# Altium footprint library KHOEMACH_PCBLIB.PcbLib: 28 footprints (part 2 of 2)
Each footprint in its own frame and in the unit in brackets; x right, y up, seen from the top. Pads: shape width x height; smd on the part's side, far side on the other; paste and mask are expansions set on the pad; w line width, h text height; cw(c..) or ccw(c..) is an arc to the next point about the centre after c.
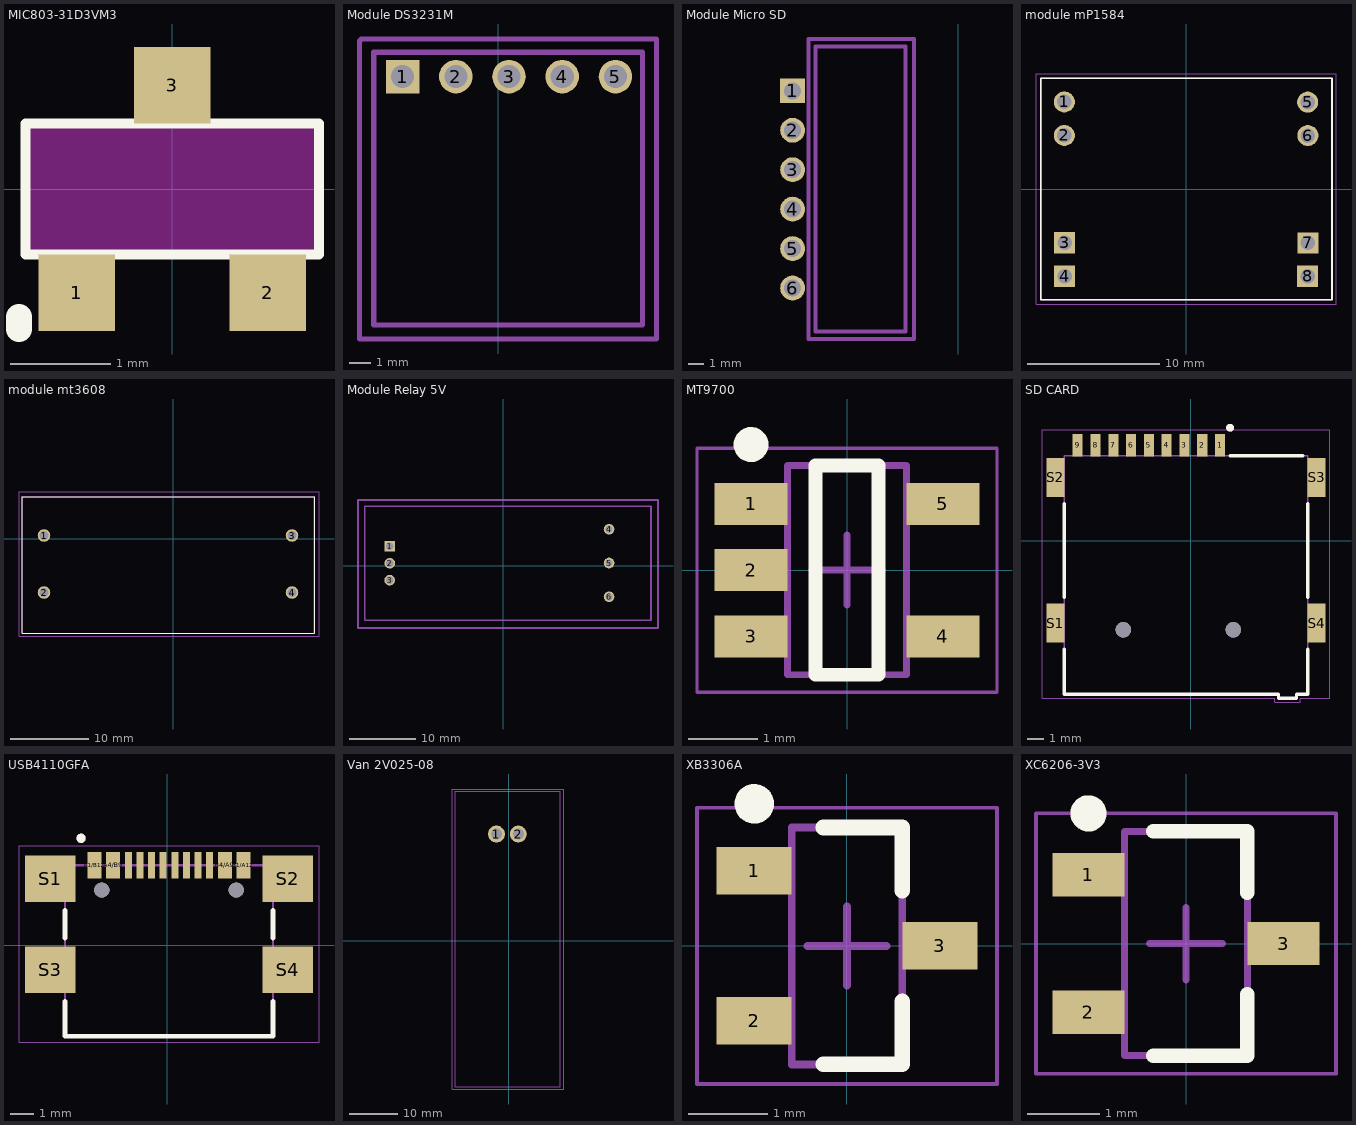
[diagram p1: the footprints below, top view; thin cyan lines are the x and y axes]

## MIC803-31D3VM3 [mm]
pads (3):
  rect 0.76x0.76 smd paste+0 mask+0.05: 1(-0.95,-1.03) 2(0.95,-1.03) 3(0,1.03)
Top Layer keep-out:
  rectangle: -1.46,-0.65 1.46,0.65
Top Overlay:
  lines w0.1: -1.46,-0.65 1.46,-0.65 1.46,0.65 -1.46,0.65 -1.46,-0.65
  lines w0.254: -1.524,-1.397 -1.524,-1.27
3D body "SOT-23_M3_MCH.step": height 1.12, standoff 0, extent -1.524,-1.321 1.524,1.321

## Module DS3231M [mm]
pads (5):
  rect 1.6x1.6 hole 1.1: 1(-4.572,25.4)
  round 1.6 hole 1.1: 2(-2.032,25.4) 3(0.508,25.4) 4(3.048,25.4) 5(5.588,25.4)
Mechanical 13:
  lines w0.254: -5.95,13.55 -5.95,26.57 6.88,26.57 6.88,13.55 -5.95,13.55
Mechanical 15:
  lines w0.254: -6.63,12.88 7.55,12.88 7.55,27.197 -6.537,27.197 -6.63,27.104 -6.63,12.88
3D body "DS3231 Module With Header.step": height 16.35, standoff -1.74, extent -5.87,13.61 6.83,26.61

## Module Micro SD [mm]
pads (6):
  rect 1.6x1.6 hole 1.1: 1(-10.671,34.07)
  round 1.6 hole 1.1: 2(-10.671,31.53) 3(-10.671,28.99) 4(-10.671,26.45) 5(-10.671,23.91) 6(-10.671,21.37)
Mechanical 13:
  lines w0.254: -9.188,18.581 -3.405,18.581 -3.405,36.915 -9.188,36.915 -9.188,18.581
Mechanical 15:
  lines w0.254: -9.657,18.09 -2.869,18.09 -2.869,37.406 -9.657,37.406 -9.657,18.09
3D body "MicroSD Card Module - 1.stp": height 23.36, standoff 2.73, extent -8.262,18.682 -4.861,36.792
3D body "4Pin.stp": height 5.27, standoff -3.18, extent -11.002,25.188 -3.702,35.348
3D body "2Pin.stp": height 5.27, standoff -3.18, extent -11.002,20.108 -3.702,25.188

## module mP1584 [mm]
height 6.6
pads (8):
  round 1.6 hole 1.1: 1(-9.271,6.604) 2(-9.271,4.064) 5(9.2,6.59) 6(9.21,4.06)
  rect 1.6x1.6 hole 1.1: 3(-9.25,-4.08) 4(-9.25,-6.62) 7(9.21,-4.09) 8(9.19,-6.62)
Top Overlay:
  lines w0.127: -11.06,-8.4 -11.06,8.4 11.04,8.4 11.04,-8.4 -11.06,-8.4
Mechanical 13:
  lines w0.127: -11.04,-8.4 -11.04,8.4 11.06,8.4 11.06,-8.4 -11.04,-8.4
Mechanical 15:
  lines w0.05: -11.42,-8.76 11.35,-8.76 11.35,8.76 -11.42,8.76 -11.42,-8.76
3D body "D-SUN dc-dc step down converter.step": height 6.19, standoff 2, extent -11.05,-8.4 11.05,8.4
3D body "Header, Male, 2.54mm, 1x2.STEP": height 5.54, standoff -6, extent 7.935,-7.929 10.475,-2.849
3D body "Header, Male, 2.54mm, 1x2.STEP": height 5.54, standoff -6, extent -10.52,-7.89 -7.98,-2.81
3D body "Header, Male, 2.54mm, 1x2.STEP": height 5.54, standoff -6, extent -10.536,2.766 -7.996,7.846
3D body "Header, Male, 2.54mm, 1x2.STEP": height 5.54, standoff -6, extent 7.949,2.778 10.489,7.858

## module mt3608 [mm]
height 6.6
pads (4):
  round 1.6 hole 1.1: 1(-16.383,0.381) 2(-16.383,-6.858) 3(15.113,0.381) 4(15.113,-6.858)
Top Overlay:
  lines w0.127: -19.177,-12.065 17.907,-12.065 17.907,5.334 -19.177,5.334 -19.177,-12.065
Mechanical 13:
  lines w0.127: -19.177,-12.065 17.907,-12.065 17.907,5.334 -19.177,5.334 -19.177,-12.065
Mechanical 15:
  lines w0.05: -19.558,-12.446 -19.558,5.969 18.542,5.969 18.542,-12.446 -19.558,-12.446
3D body "MT3608 Converter.STEP": height 9.15, standoff 1.85, extent -19.21,-12.091 17.94,5.334
3D body "1x1 Male Pin Header.stp": height 7.54, standoff -6, extent -17.648,-8.103 -15.103,-5.603
3D body "1x1 Male Pin Header.stp": height 7.54, standoff -6, extent -17.676,-0.846 -15.131,1.654
3D body "1x1 Male Pin Header.stp": height 7.54, standoff -6, extent 13.843,-8.125 16.388,-5.625
3D body "1x1 Male Pin Header.stp": height 7.54, standoff -6, extent 13.838,-0.869 16.383,1.631

## Module Relay 5V [mm]
pads (6):
  rect 1.6x1.6 hole 1.1: 1(-17.121,2.93)
  round 1.6 hole 1.1: 2(-17.091,0.39) 3(-17.121,-2.15) 4(15.884,5.506) 5(15.884,0.426) 6(15.884,-4.654)
Mechanical 13:
  lines w0.254: -20.852,-8.162 22.199,-8.162 22.199,8.954 -20.852,8.954 -20.852,-8.162
Mechanical 15:
  lines w0.254: -21.882,-9.359 -21.882,9.918 23.25,9.918 23.25,-9.359 -21.882,-9.359
3D body "Header, Male, 2.54mm, 1x3.STEP": height 6, standoff -5.54, extent -18.389,-3.435 -15.849,4.185
3D body "Relay Module 5V.SLDPRT": height 21.7, standoff 1, extent -20.801,-8.116 22.199,8.984
3D body "Header, Male, 2.54mm, 1x5.STEP": height 5.54, standoff -6, extent 14.614,-5.924 17.154,6.776

## MT9700 [mm]
height 1.15
pads (5):
  rect 1.05x0.6 smd: 1(-1.375,0.95) 2(-1.375,0) 3(-1.375,-0.95) 4(1.375,-0.95) 5(1.375,0.95)
Top Overlay:
  circle w0.25: c-1.375,1.8 r0.125
  lines w0.2: -0.45,-1.5 0.45,-1.5 0.45,1.5 -0.45,1.5 -0.45,-1.5
Mechanical 13:
  lines w0.1: -0.85,-1.5 -0.85,1.5 0.85,1.5 0.85,-1.5 -0.85,-1.5
Mechanical 15:
  lines w0.05: -2.15,-1.75 -2.15,1.75 2.15,1.75 2.15,-1.75 -2.15,-1.75
  lines w0.1: -0.5,0 0.5,0 ; 0,-0.5 0,0.5
3D body: height 1.15, standoff 0.1, extent -0.85,-1.5 0.85,1.5
3D body "MT9700.stp": height 1.35, standoff 0, extent -1.4,-1.45 1.4,1.45

## SD CARD [mm]
pads (15):
  rect 0.62x1.4 smd: 1(1.817,5.912) 2(0.717,5.912) 3(-0.383,5.912) 4(-1.483,5.912) 5(-2.583,5.912) 6(-3.683,5.912) 7(-4.783,5.912) 8(-5.883,5.912) 9(-6.983,5.912)
  rect 1.1x2.4 smd: S1(-8.363,-5.088) S2(-8.363,3.912) S3(7.787,3.912) S4(7.787,-5.088)
  round 0.95 hole 0.95 unplated: ""(-4.163,-5.508) ""(2.637,-5.508)
Top Overlay:
  circle w0.24: c2.437,6.992 r0.12
  lines w0.2: -7.813,-6.708 -7.813,-9.488 5.437,-9.488 5.437,-9.738 6.537,-9.738 6.537,-9.488 7.237,-9.488 7.237,-6.708 ; -7.813,-3.508 -7.813,2.292 ; 2.437,5.262 6.937,5.262 ; 7.237,-3.508 7.237,2.292
Mechanical 13:
  circle w0.24: c2.437,6.992 r0.12
  lines w0.1: -7.813,-9.488 5.437,-9.488 5.437,-9.738 6.537,-9.738 6.537,-9.488 7.237,-9.488 7.237,5.262 -7.813,5.262 -7.813,-9.488
Mechanical 15:
  lines w0.05: -9.163,-9.738 -9.163,6.862 8.587,6.862 8.587,-9.738 6.787,-9.738 6.787,-9.988 5.187,-9.988 5.187,-9.738 -9.163,-9.738
3D body "MEM2075-00-140-01-A--3DModel-STEP-56544.STEP": height 1.45, standoff -0.6, extent -8.555,-9.644 7.885,6.206

## USB4110GFA [mm]
pads (18):
  rect 0.6x1.15 smd: A1/B12(-3.13,3.443) A4/B9(-2.33,3.443) B1/A12(3.27,3.443) B4/A9(2.47,3.443)
  rect 0.3x1.15 smd: A5(-1.18,3.443) A6(-0.18,3.443) A7(0.32,3.443) A8(1.32,3.443) B5(1.82,3.443) B6(0.82,3.443) B7(-0.68,3.443) B8(-1.68,3.443)
  rect 2.18x2 smd: S1(-5.04,2.868) S2(5.18,2.868) S3(-5.04,-1.062) S4(5.18,-1.062)
  round 0.65 hole 0.65 unplated: ""(-2.82,2.368) ""(2.96,2.368)
Top Overlay:
  circle w0.2: c-3.71,4.598 r0.1
  lines w0.2: -4.4,-2.422 -4.4,-3.912 4.54,-3.912 4.54,-2.422 ; -4.4,0.298 -4.4,1.508 ; 4.54,0.298 4.54,1.508
Mechanical 13:
  circle w0.2: c-3.71,4.598 r0.1
  lines w0.1: -4.4,-3.912 4.54,-3.912 4.54,3.438 -4.4,3.438 -4.4,-3.912
Mechanical 15:
  lines w0.05: -6.38,-4.162 -6.38,4.268 6.52,4.268 6.52,-4.162 -6.38,-4.162
3D body "step_temp.STEP": height 3.26, standoff -0.63, extent -5.58,-3.912 5.72,3.788

## Van 2V025-08 [mil]
pads (2):
  round 138.74 hole 89.06: 1(-100,875) 2(80,875)
Mechanical 13:
  lines w10: -440,-1200 -440,1225 425,1225 425,-1200 -440,-1200
Mechanical 15:
  lines w10: -465,-1220 455,-1220 455,1245 -450,1245 -465,1245 -465,-1220
3D body "2V025-08, 2 POSITION, 2 WAY SOLENOID VALVE.STEP": height -192.91, standoff -3149.61, extent -441.14,-1197.6 425,1227.6

## XB3306A [mm]
height 1.1
pads (3):
  rect 0.95x0.6 smd: 1(-1.175,0.95) 2(-1.175,-0.95) 3(1.175,0)
Top Overlay:
  circle w0.25: c-1.175,1.8 r0.125
  lines w0.2: -0.3,-1.5 0.7,-1.5 0.7,-0.7 ; -0.3,1.5 0.7,1.5 0.7,0.7
Mechanical 13:
  lines w0.1: -0.7,-1.5 -0.7,1.5 0.7,1.5 0.7,-1.5 -0.7,-1.5
Mechanical 15:
  lines w0.05: -1.9,-1.75 -1.9,1.75 1.9,1.75 1.9,-1.75 -1.9,-1.75
  lines w0.1: -0.5,0 0.5,0 ; 0,-0.5 0,0.5
3D body: height 1.1, standoff 0.1, extent -0.7,-1.5 0.7,1.5

## XC6206-3V3 [mm] "SOT23-3"
height 1.1
pads (3):
  rect 1x0.6 smd: 1(-1.35,0.95) 2(-1.35,-0.95) 3(1.35,0)
Top Overlay:
  circle w0.25: c-1.35,1.8 r0.125
  lines w0.2: -0.45,-1.55 0.85,-1.55 0.85,-0.7 ; -0.45,1.55 0.85,1.55 0.85,0.7
Mechanical 13:
  lines w0.1: -0.85,-1.55 0.85,-1.55 0.85,1.55 -0.85,1.55 -0.85,-1.55
Mechanical 15:
  lines w0.05: -2.075,-1.8 2.075,-1.8 2.075,1.8 -2.075,1.8 -2.075,-1.8
  lines w0.1: -0.5,0 0.5,0 ; 0,-0.5 0,0.5
3D body: height 1.1, standoff 0.1, extent -0.85,-1.55 0.85,1.55
3D body "XC6206P332MR-G.STEP": height 1.3, standoff 0, extent -1.4,-1.45 1.4,1.45